# Altium footprint library ref-packages.PCBLIB: 1544 footprints (part 73 of 103)
Each footprint in its own frame and in the unit in brackets; x right, y up, seen from the top. Pads: shape width x height; smd on the part's side, far side on the other; paste and mask are expansions set on the pad; w line width, h text height; cw(c..) or ccw(c..) is an arc to the next point about the centre after c.
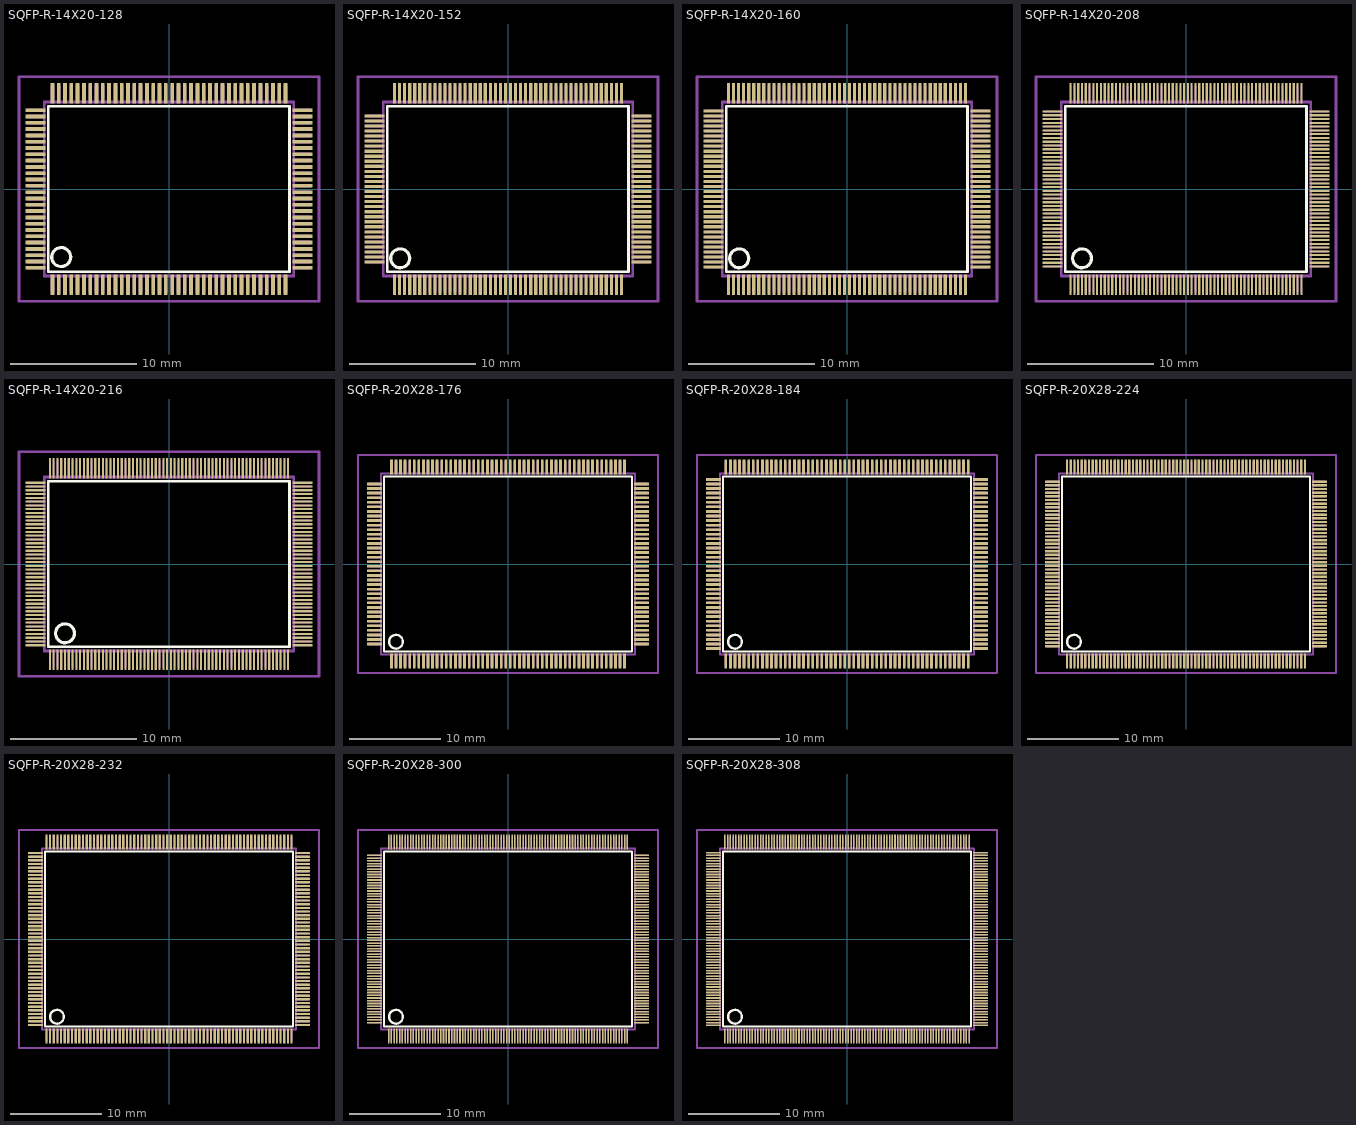
[diagram p72: the footprints below, top view; thin cyan lines are the x and y axes]

## SQFP-R-14X20-128 [mil]
pads (128):
  rect 11.81x62.99 smd: 1(-364.17,-299.21) 2(-344.49,-299.21) 3(-324.8,-299.21) 4(-305.12,-299.21) 5(-285.43,-299.21) 6(-265.75,-299.21) 7(-246.06,-299.21) 8(-226.38,-299.21) 9(-206.69,-299.21) 10(-187.01,-299.21) 11(-167.32,-299.21) 12(-147.64,-299.21) 13(-127.95,-299.21) 14(-108.27,-299.21) 15(-88.58,-299.21) 16(-68.9,-299.21) 17(-49.21,-299.21) 18(-29.53,-299.21) 19(-9.84,-299.21) 20(9.84,-299.21) 21(29.53,-299.21) 22(49.21,-299.21) 23(68.9,-299.21) 24(88.58,-299.21) 25(108.27,-299.21) 26(127.95,-299.21) 27(147.64,-299.21) 28(167.32,-299.21) 29(187.01,-299.21) 30(206.69,-299.21) 31(226.38,-299.21) 32(246.06,-299.21) 33(265.75,-299.21) 34(285.43,-299.21) 35(305.12,-299.21) 36(324.8,-299.21) 37(344.49,-299.21) 38(364.17,-299.21) 65(364.17,299.21) 66(344.49,299.21) 67(324.8,299.21) 68(305.12,299.21) 69(285.43,299.21) 70(265.75,299.21) 71(246.06,299.21) 72(226.38,299.21) 73(206.69,299.21) 74(187.01,299.21) 75(167.32,299.21) 76(147.64,299.21) 77(127.95,299.21) 78(108.27,299.21) 79(88.58,299.21) 80(68.9,299.21) 81(49.21,299.21) 82(29.53,299.21) 83(9.84,299.21) 84(-9.84,299.21) 85(-29.53,299.21) 86(-49.21,299.21) 87(-68.9,299.21) 88(-88.58,299.21) 89(-108.27,299.21) 90(-127.95,299.21) 91(-147.64,299.21) 92(-167.32,299.21) 93(-187.01,299.21) 94(-206.69,299.21) 95(-226.38,299.21) 96(-246.06,299.21) 97(-265.75,299.21) 98(-285.43,299.21) 99(-305.12,299.21) 100(-324.8,299.21) 101(-344.49,299.21) 102(-364.17,299.21)
  rect 62.99x11.81 smd: 39(417.32,-246.06) 40(417.32,-226.38) 41(417.32,-206.69) 42(417.32,-187.01) 43(417.32,-167.32) 44(417.32,-147.64) 45(417.32,-127.95) 46(417.32,-108.27) 47(417.32,-88.58) 48(417.32,-68.9) 49(417.32,-49.21) 50(417.32,-29.53) 51(417.32,-9.84) 52(417.32,9.84) 53(417.32,29.53) 54(417.32,49.21) 55(417.32,68.9) 56(417.32,88.58) 57(417.32,108.27) 58(417.32,127.95) 59(417.32,147.64) 60(417.32,167.32) 61(417.32,187.01) 62(417.32,206.69) 63(417.32,226.38) 64(417.32,246.06) 103(-417.32,246.06) 104(-417.32,226.38) 105(-417.32,206.69) 106(-417.32,187.01) 107(-417.32,167.32) 108(-417.32,147.64) 109(-417.32,127.95) 110(-417.32,108.27) 111(-417.32,88.58) 112(-417.32,68.9) 113(-417.32,49.21) 114(-417.32,29.53) 115(-417.32,9.84) 116(-417.32,-9.84) 117(-417.32,-29.53) 118(-417.32,-49.21) 119(-417.32,-68.9) 120(-417.32,-88.58) 121(-417.32,-108.27) 122(-417.32,-127.95) 123(-417.32,-147.64) 124(-417.32,-167.32) 125(-417.32,-187.01) 126(-417.32,-206.69) 127(-417.32,-226.38) 128(-417.32,-246.06)
Top Overlay:
  circle w10: c-336.61,-212.6 r29.52
  lines w8: -376.77,-258.27 376.38,-258.27 376.38,258.27 -376.77,258.27 -376.77,-258.27
Mechanical 16:
  rectangle: -370.08,-323.62 -358.27,-273.62
  rectangle: -350.39,-323.62 -338.58,-273.62
  rectangle: -330.71,-323.62 -318.9,-273.62
  rectangle: -311.02,-323.62 -299.21,-273.62
  rectangle: -291.34,-323.62 -279.53,-273.62
  rectangle: -271.65,-323.62 -259.84,-273.62
  rectangle: -251.97,-323.62 -240.16,-273.62
  rectangle: -232.28,-323.62 -220.47,-273.62
  rectangle: -212.6,-323.62 -200.79,-273.62
  rectangle: -192.91,-323.62 -181.1,-273.62
  rectangle: -173.23,-323.62 -161.42,-273.62
  rectangle: -153.54,-323.62 -141.73,-273.62
  rectangle: -133.86,-323.62 -122.05,-273.62
  rectangle: -114.17,-323.62 -102.36,-273.62
  rectangle: -94.49,-323.62 -82.68,-273.62
  rectangle: -74.8,-323.62 -62.99,-273.62
  rectangle: -55.12,-323.62 -43.31,-273.62
  rectangle: -35.43,-323.62 -23.62,-273.62
  rectangle: -15.75,-323.62 -3.94,-273.62
  rectangle: 3.94,-323.62 15.75,-273.62
  rectangle: 23.62,-323.62 35.43,-273.62
  rectangle: 43.31,-323.62 55.12,-273.62
  rectangle: 62.99,-323.62 74.8,-273.62
  rectangle: 82.68,-323.62 94.49,-273.62
  rectangle: 102.36,-323.62 114.17,-273.62
  rectangle: 122.05,-323.62 133.86,-273.62
  rectangle: 141.73,-323.62 153.54,-273.62
  rectangle: 161.42,-323.62 173.23,-273.62
  rectangle: 181.1,-323.62 192.91,-273.62
  rectangle: 200.79,-323.62 212.6,-273.62
  rectangle: 220.47,-323.62 232.28,-273.62
  rectangle: 240.16,-323.62 251.97,-273.62
  rectangle: 259.84,-323.62 271.65,-273.62
  rectangle: 279.53,-323.62 291.34,-273.62
  rectangle: 299.21,-323.62 311.02,-273.62
  rectangle: 318.9,-323.62 330.71,-273.62
  rectangle: 391.73,-251.97 441.73,-240.16
  rectangle: 338.58,-323.62 350.39,-273.62
  rectangle: 358.27,-323.62 370.08,-273.62
  rectangle: 391.73,-232.28 441.73,-220.47
  rectangle: 391.73,-212.6 441.73,-200.79
  rectangle: 391.73,-192.91 441.73,-181.1
  rectangle: 391.73,-173.23 441.73,-161.42
  rectangle: 391.73,-153.54 441.73,-141.73
  rectangle: 391.73,-133.86 441.73,-122.05
  rectangle: 391.73,-114.17 441.73,-102.36
  rectangle: 391.73,-94.49 441.73,-82.68
  rectangle: 391.73,-74.8 441.73,-62.99
  rectangle: 391.73,-55.12 441.73,-43.31
  rectangle: 391.73,-35.43 441.73,-23.62
  rectangle: 391.73,-15.75 441.73,-3.94
  rectangle: 391.73,3.94 441.73,15.75
  rectangle: 391.73,23.62 441.73,35.43
  rectangle: 391.73,43.31 441.73,55.12
  rectangle: 391.73,62.99 441.73,74.8
  rectangle: 391.73,82.68 441.73,94.49
  rectangle: 391.73,102.36 441.73,114.17
  rectangle: 391.73,122.05 441.73,133.86
  rectangle: 391.73,141.73 441.73,153.54
  rectangle: 391.73,161.42 441.73,173.23
  rectangle: 391.73,181.1 441.73,192.91
  rectangle: 391.73,200.79 441.73,212.6
  rectangle: 391.73,220.47 441.73,232.28
  rectangle: 391.73,240.16 441.73,251.97
  rectangle: 358.27,273.62 370.08,323.62
  rectangle: 338.58,273.62 350.39,323.62
  rectangle: 318.9,273.62 330.71,323.62
  rectangle: 299.21,273.62 311.02,323.62
  rectangle: 279.53,273.62 291.34,323.62
  rectangle: 259.84,273.62 271.65,323.62
  rectangle: 240.16,273.62 251.97,323.62
  rectangle: 220.47,273.62 232.28,323.62
  rectangle: 200.79,273.62 212.6,323.62
  rectangle: 181.1,273.62 192.91,323.62
  rectangle: 161.42,273.62 173.23,323.62
  rectangle: 141.73,273.62 153.54,323.62
  rectangle: 122.05,273.62 133.86,323.62
  rectangle: 102.36,273.62 114.17,323.62
  rectangle: 82.68,273.62 94.49,323.62
  rectangle: 62.99,273.62 74.8,323.62
  rectangle: 43.31,273.62 55.12,323.62
  rectangle: 23.62,273.62 35.43,323.62
  rectangle: 3.94,273.62 15.75,323.62
  rectangle: -15.75,273.62 -3.94,323.62
  rectangle: -35.43,273.62 -23.62,323.62
  rectangle: -55.12,273.62 -43.31,323.62
  rectangle: -74.8,273.62 -62.99,323.62
  rectangle: -94.49,273.62 -82.68,323.62
  rectangle: -114.17,273.62 -102.36,323.62
  rectangle: -133.86,273.62 -122.05,323.62
  rectangle: -153.54,273.62 -141.73,323.62
  rectangle: -173.23,273.62 -161.42,323.62
  rectangle: -192.91,273.62 -181.1,323.62
  rectangle: -212.6,273.62 -200.79,323.62
  rectangle: -232.28,273.62 -220.47,323.62
  rectangle: -251.97,273.62 -240.16,323.62
  rectangle: -271.65,273.62 -259.84,323.62
  rectangle: -291.34,273.62 -279.53,323.62
  rectangle: -311.02,273.62 -299.21,323.62
  rectangle: -330.71,273.62 -318.9,323.62
  rectangle: -350.39,273.62 -338.58,323.62
  rectangle: -370.08,273.62 -358.27,323.62
  rectangle: -441.73,240.16 -391.73,251.97
  rectangle: -441.73,220.47 -391.73,232.28
  rectangle: -441.73,200.79 -391.73,212.6
  rectangle: -441.73,181.1 -391.73,192.91
  rectangle: -441.73,161.42 -391.73,173.23
  rectangle: -441.73,141.73 -391.73,153.54
  rectangle: -441.73,122.05 -391.73,133.86
  rectangle: -441.73,102.36 -391.73,114.17
  rectangle: -441.73,82.68 -391.73,94.49
  rectangle: -441.73,62.99 -391.73,74.8
  rectangle: -441.73,43.31 -391.73,55.12
  rectangle: -441.73,23.62 -391.73,35.43
  rectangle: -441.73,3.94 -391.73,15.75
  rectangle: -441.73,-15.75 -391.73,-3.94
  rectangle: -441.73,-35.43 -391.73,-23.62
  rectangle: -441.73,-55.12 -391.73,-43.31
  rectangle: -441.73,-74.8 -391.73,-62.99
  rectangle: -441.73,-94.49 -391.73,-82.68
  rectangle: -441.73,-114.17 -391.73,-102.36
  rectangle: -441.73,-133.86 -391.73,-122.05
  rectangle: -441.73,-153.54 -391.73,-141.73
  rectangle: -441.73,-173.23 -391.73,-161.42
  rectangle: -441.73,-192.91 -391.73,-181.1
  rectangle: -441.73,-212.6 -391.73,-200.79
  rectangle: -441.73,-232.28 -391.73,-220.47
  rectangle: -441.73,-251.97 -391.73,-240.16
  lines w8: -389.76,-271.65 389.76,-271.65 389.76,271.65 -389.76,271.65 -389.76,-271.65
Mechanical 27:
  lines w7.87: -468.5,-350.39 -468.5,350.39 468.5,350.39 468.5,-350.39 -468.5,-350.39

## SQFP-R-14X20-152 [mm]
pads (152):
  rect 0.25x1.6 smd: 1(-9,-7.6) 2(-8.6,-7.6) 3(-8.2,-7.6) 4(-7.8,-7.6) 5(-7.4,-7.6) 6(-7,-7.6) 7(-6.6,-7.6) 8(-6.2,-7.6) 9(-5.8,-7.6) 10(-5.4,-7.6) 11(-5,-7.6) 12(-4.6,-7.6) 13(-4.2,-7.6) 14(-3.8,-7.6) 15(-3.4,-7.6) 16(-3,-7.6) 17(-2.6,-7.6) 18(-2.2,-7.6) 19(-1.8,-7.6) 20(-1.4,-7.6) 21(-1,-7.6) 22(-0.6,-7.6) 23(-0.2,-7.6) 24(0.2,-7.6) 25(0.6,-7.6) 26(1,-7.6) 27(1.4,-7.6) 28(1.8,-7.6) 29(2.2,-7.6) 30(2.6,-7.6) 31(3,-7.6) 32(3.4,-7.6) 33(3.8,-7.6) 34(4.2,-7.6) 35(4.6,-7.6) 36(5,-7.6) 37(5.4,-7.6) 38(5.8,-7.6) 39(6.2,-7.6) 40(6.6,-7.6) 41(7,-7.6) 42(7.4,-7.6) 43(7.8,-7.6) 44(8.2,-7.6) 45(8.6,-7.6) 46(9,-7.6) 77(9,7.6) 78(8.6,7.6) 79(8.2,7.6) 80(7.8,7.6) 81(7.4,7.6) 82(7,7.6) 83(6.6,7.6) 84(6.2,7.6) 85(5.8,7.6) 86(5.4,7.6) 87(5,7.6) 88(4.6,7.6) 89(4.2,7.6) 90(3.8,7.6) 91(3.4,7.6) 92(3,7.6) 93(2.6,7.6) 94(2.2,7.6) 95(1.8,7.6) 96(1.4,7.6) 97(1,7.6) 98(0.6,7.6) 99(0.2,7.6) 100(-0.2,7.6) 101(-0.6,7.6) 102(-1,7.6) 103(-1.4,7.6) 104(-1.8,7.6) 105(-2.2,7.6) 106(-2.6,7.6) 107(-3,7.6) 108(-3.4,7.6) 109(-3.8,7.6) 110(-4.2,7.6) 111(-4.6,7.6) 112(-5,7.6) 113(-5.4,7.6) 114(-5.8,7.6) 115(-6.2,7.6) 116(-6.6,7.6) 117(-7,7.6) 118(-7.4,7.6) 119(-7.8,7.6) 120(-8.2,7.6) 121(-8.6,7.6) 122(-9,7.6)
  rect 1.6x0.25 smd: 47(10.6,-5.8) 48(10.6,-5.4) 49(10.6,-5) 50(10.6,-4.6) 51(10.6,-4.2) 52(10.6,-3.8) 53(10.6,-3.4) 54(10.6,-3) 55(10.6,-2.6) 56(10.6,-2.2) 57(10.6,-1.8) 58(10.6,-1.4) 59(10.6,-1) 60(10.6,-0.6) 61(10.6,-0.2) 62(10.6,0.2) 63(10.6,0.6) 64(10.6,1) 65(10.6,1.4) 66(10.6,1.8) 67(10.6,2.2) 68(10.6,2.6) 69(10.6,3) 70(10.6,3.4) 71(10.6,3.8) 72(10.6,4.2) 73(10.6,4.6) 74(10.6,5) 75(10.6,5.4) 76(10.6,5.8) 123(-10.6,5.8) 124(-10.6,5.4) 125(-10.6,5) 126(-10.6,4.6) 127(-10.6,4.2) 128(-10.6,3.8) 129(-10.6,3.4) 130(-10.6,3) 131(-10.6,2.6) 132(-10.6,2.2) 133(-10.6,1.8) 134(-10.6,1.4) 135(-10.6,1) 136(-10.6,0.6) 137(-10.6,0.2) 138(-10.6,-0.2) 139(-10.6,-0.6) 140(-10.6,-1) 141(-10.6,-1.4) 142(-10.6,-1.8) 143(-10.6,-2.2) 144(-10.6,-2.6) 145(-10.6,-3) 146(-10.6,-3.4) 147(-10.6,-3.8) 148(-10.6,-4.2) 149(-10.6,-4.6) 150(-10.6,-5) 151(-10.6,-5.4) 152(-10.6,-5.8)
Top Overlay:
  circle w0.254: c-8.55,-5.5 r0.75
  lines w0.203: -9.57,-6.56 9.56,-6.56 9.56,6.56 -9.57,6.56 -9.57,-6.56
Mechanical 16:
  drawing of 156 lines, arcs and shapes, not listed
Mechanical 27:
  lines w0.2: -11.9,-8.9 -11.9,8.9 11.9,8.9 11.9,-8.9 -11.9,-8.9

## SQFP-R-14X20-160 [mm]
pads (160):
  rect 0.25x1.6 smd: 1(-9.4,-7.6) 2(-9,-7.6) 3(-8.6,-7.6) 4(-8.2,-7.6) 5(-7.8,-7.6) 6(-7.4,-7.6) 7(-7,-7.6) 8(-6.6,-7.6) 9(-6.2,-7.6) 10(-5.8,-7.6) 11(-5.4,-7.6) 12(-5,-7.6) 13(-4.6,-7.6) 14(-4.2,-7.6) 15(-3.8,-7.6) 16(-3.4,-7.6) 17(-3,-7.6) 18(-2.6,-7.6) 19(-2.2,-7.6) 20(-1.8,-7.6) 21(-1.4,-7.6) 22(-1,-7.6) 23(-0.6,-7.6) 24(-0.2,-7.6) 25(0.2,-7.6) 26(0.6,-7.6) 27(1,-7.6) 28(1.4,-7.6) 29(1.8,-7.6) 30(2.2,-7.6) 31(2.6,-7.6) 32(3,-7.6) 33(3.4,-7.6) 34(3.8,-7.6) 35(4.2,-7.6) 36(4.6,-7.6) 37(5,-7.6) 38(5.4,-7.6) 39(5.8,-7.6) 40(6.2,-7.6) 41(6.6,-7.6) 42(7,-7.6) 43(7.4,-7.6) 44(7.8,-7.6) 45(8.2,-7.6) 46(8.6,-7.6) 47(9,-7.6) 48(9.4,-7.6) 81(9.4,7.6) 82(9,7.6) 83(8.6,7.6) 84(8.2,7.6) 85(7.8,7.6) 86(7.4,7.6) 87(7,7.6) 88(6.6,7.6) 89(6.2,7.6) 90(5.8,7.6) 91(5.4,7.6) 92(5,7.6) 93(4.6,7.6) 94(4.2,7.6) 95(3.8,7.6) 96(3.4,7.6) 97(3,7.6) 98(2.6,7.6) 99(2.2,7.6) 100(1.8,7.6) 101(1.4,7.6) 102(1,7.6) 103(0.6,7.6) 104(0.2,7.6) 105(-0.2,7.6) 106(-0.6,7.6) 107(-1,7.6) 108(-1.4,7.6) 109(-1.8,7.6) 110(-2.2,7.6) 111(-2.6,7.6) 112(-3,7.6) 113(-3.4,7.6) 114(-3.8,7.6) 115(-4.2,7.6) 116(-4.6,7.6) 117(-5,7.6) 118(-5.4,7.6) 119(-5.8,7.6) 120(-6.2,7.6) 121(-6.6,7.6) 122(-7,7.6) 123(-7.4,7.6) 124(-7.8,7.6) 125(-8.2,7.6) 126(-8.6,7.6) 127(-9,7.6) 128(-9.4,7.6)
  rect 1.6x0.25 smd: 49(10.6,-6.2) 50(10.6,-5.8) 51(10.6,-5.4) 52(10.6,-5) 53(10.6,-4.6) 54(10.6,-4.2) 55(10.6,-3.8) 56(10.6,-3.4) 57(10.6,-3) 58(10.6,-2.6) 59(10.6,-2.2) 60(10.6,-1.8) 61(10.6,-1.4) 62(10.6,-1) 63(10.6,-0.6) 64(10.6,-0.2) 65(10.6,0.2) 66(10.6,0.6) 67(10.6,1) 68(10.6,1.4) 69(10.6,1.8) 70(10.6,2.2) 71(10.6,2.6) 72(10.6,3) 73(10.6,3.4) 74(10.6,3.8) 75(10.6,4.2) 76(10.6,4.6) 77(10.6,5) 78(10.6,5.4) 79(10.6,5.8) 80(10.6,6.2) 129(-10.6,6.2) 130(-10.6,5.8) 131(-10.6,5.4) 132(-10.6,5) 133(-10.6,4.6) 134(-10.6,4.2) 135(-10.6,3.8) 136(-10.6,3.4) 137(-10.6,3) 138(-10.6,2.6) 139(-10.6,2.2) 140(-10.6,1.8) 141(-10.6,1.4) 142(-10.6,1) 143(-10.6,0.6) 144(-10.6,0.2) 145(-10.6,-0.2) 146(-10.6,-0.6) 147(-10.6,-1) 148(-10.6,-1.4) 149(-10.6,-1.8) 150(-10.6,-2.2) 151(-10.6,-2.6) 152(-10.6,-3) 153(-10.6,-3.4) 154(-10.6,-3.8) 155(-10.6,-4.2) 156(-10.6,-4.6) 157(-10.6,-5) 158(-10.6,-5.4) 159(-10.6,-5.8) 160(-10.6,-6.2)
Top Overlay:
  circle w0.254: c-8.55,-5.5 r0.75
  lines w0.203: -9.57,-6.56 9.56,-6.56 9.56,6.56 -9.57,6.56 -9.57,-6.56
Mechanical 16:
  drawing of 164 lines, arcs and shapes, not listed
Mechanical 27:
  lines w0.2: -11.9,-8.9 -11.9,8.9 11.9,8.9 11.9,-8.9 -11.9,-8.9

## SQFP-R-14X20-208 [mm]
pads (208):
  rect 0.17x1.6 smd: 1(-9.15,-7.6) 2(-8.85,-7.6) 3(-8.55,-7.6) 4(-8.25,-7.6) 5(-7.95,-7.6) 6(-7.65,-7.6) 7(-7.35,-7.6) 8(-7.05,-7.6) 9(-6.75,-7.6) 10(-6.45,-7.6) 11(-6.15,-7.6) 12(-5.85,-7.6) 13(-5.55,-7.6) 14(-5.25,-7.6) 15(-4.95,-7.6) 16(-4.65,-7.6) 17(-4.35,-7.6) 18(-4.05,-7.6) 19(-3.75,-7.6) 20(-3.45,-7.6) 21(-3.15,-7.6) 22(-2.85,-7.6) 23(-2.55,-7.6) 24(-2.25,-7.6) 25(-1.95,-7.6) 26(-1.65,-7.6) 27(-1.35,-7.6) 28(-1.05,-7.6) 29(-0.75,-7.6) 30(-0.45,-7.6) 31(-0.15,-7.6) 32(0.15,-7.6) 33(0.45,-7.6) 34(0.75,-7.6) 35(1.05,-7.6) 36(1.35,-7.6) 37(1.65,-7.6) 38(1.95,-7.6) 39(2.25,-7.6) 40(2.55,-7.6) 41(2.85,-7.6) 42(3.15,-7.6) 43(3.45,-7.6) 44(3.75,-7.6) 45(4.05,-7.6) 46(4.35,-7.6) 47(4.65,-7.6) 48(4.95,-7.6) 49(5.25,-7.6) 50(5.55,-7.6) 51(5.85,-7.6) 52(6.15,-7.6) 53(6.45,-7.6) 54(6.75,-7.6) 55(7.05,-7.6) 56(7.35,-7.6) 57(7.65,-7.6) 58(7.95,-7.6) 59(8.25,-7.6) 60(8.55,-7.6) 61(8.85,-7.6) 62(9.15,-7.6) 105(9.15,7.6) 106(8.85,7.6) 107(8.55,7.6) 108(8.25,7.6) 109(7.95,7.6) 110(7.65,7.6) 111(7.35,7.6) 112(7.05,7.6) 113(6.75,7.6) 114(6.45,7.6) 115(6.15,7.6) 116(5.85,7.6) 117(5.55,7.6) 118(5.25,7.6) 119(4.95,7.6) 120(4.65,7.6) 121(4.35,7.6) 122(4.05,7.6) 123(3.75,7.6) 124(3.45,7.6) 125(3.15,7.6) 126(2.85,7.6) 127(2.55,7.6) 128(2.25,7.6) 129(1.95,7.6) 130(1.65,7.6) 131(1.35,7.6) 132(1.05,7.6) 133(0.75,7.6) 134(0.45,7.6) 135(0.15,7.6) 136(-0.15,7.6) 137(-0.45,7.6) 138(-0.75,7.6) 139(-1.05,7.6) 140(-1.35,7.6) 141(-1.65,7.6) 142(-1.95,7.6) 143(-2.25,7.6) 144(-2.55,7.6) 145(-2.85,7.6) 146(-3.15,7.6) 147(-3.45,7.6) 148(-3.75,7.6) 149(-4.05,7.6) 150(-4.35,7.6) 151(-4.65,7.6) 152(-4.95,7.6) 153(-5.25,7.6) 154(-5.55,7.6) 155(-5.85,7.6) 156(-6.15,7.6) 157(-6.45,7.6) 158(-6.75,7.6) 159(-7.05,7.6) 160(-7.35,7.6) 161(-7.65,7.6) 162(-7.95,7.6) 163(-8.25,7.6) 164(-8.55,7.6) 165(-8.85,7.6) 166(-9.15,7.6)
  rect 1.6x0.17 smd: 63(10.6,-6.15) 64(10.6,-5.85) 65(10.6,-5.55) 66(10.6,-5.25) 67(10.6,-4.95) 68(10.6,-4.65) 69(10.6,-4.35) 70(10.6,-4.05) 71(10.6,-3.75) 72(10.6,-3.45) 73(10.6,-3.15) 74(10.6,-2.85) 75(10.6,-2.55) 76(10.6,-2.25) 77(10.6,-1.95) 78(10.6,-1.65) 79(10.6,-1.35) 80(10.6,-1.05) 81(10.6,-0.75) 82(10.6,-0.45) 83(10.6,-0.15) 84(10.6,0.15) 85(10.6,0.45) 86(10.6,0.75) 87(10.6,1.05) 88(10.6,1.35) 89(10.6,1.65) 90(10.6,1.95) 91(10.6,2.25) 92(10.6,2.55) 93(10.6,2.85) 94(10.6,3.15) 95(10.6,3.45) 96(10.6,3.75) 97(10.6,4.05) 98(10.6,4.35) 99(10.6,4.65) 100(10.6,4.95) 101(10.6,5.25) 102(10.6,5.55) 103(10.6,5.85) 104(10.6,6.15) 167(-10.6,6.15) 168(-10.6,5.85) 169(-10.6,5.55) 170(-10.6,5.25) 171(-10.6,4.95) 172(-10.6,4.65) 173(-10.6,4.35) 174(-10.6,4.05) 175(-10.6,3.75) 176(-10.6,3.45) 177(-10.6,3.15) 178(-10.6,2.85) 179(-10.6,2.55) 180(-10.6,2.25) 181(-10.6,1.95) 182(-10.6,1.65) 183(-10.6,1.35) 184(-10.6,1.05) 185(-10.6,0.75) 186(-10.6,0.45) 187(-10.6,0.15) 188(-10.6,-0.15) 189(-10.6,-0.45) 190(-10.6,-0.75) 191(-10.6,-1.05) 192(-10.6,-1.35) 193(-10.6,-1.65) 194(-10.6,-1.95) 195(-10.6,-2.25) 196(-10.6,-2.55) 197(-10.6,-2.85) 198(-10.6,-3.15) 199(-10.6,-3.45) 200(-10.6,-3.75) 201(-10.6,-4.05) 202(-10.6,-4.35) 203(-10.6,-4.65) 204(-10.6,-4.95) 205(-10.6,-5.25) 206(-10.6,-5.55) 207(-10.6,-5.85) 208(-10.6,-6.15)
Top Overlay:
  circle w0.254: c-8.25,-5.5 r0.75
  lines w0.203: -9.57,-6.56 9.56,-6.56 9.56,6.56 -9.57,6.56 -9.57,-6.56
Mechanical 16:
  drawing of 212 lines, arcs and shapes, not listed
Mechanical 27:
  lines w0.2: -11.9,-8.9 -11.9,8.9 11.9,8.9 11.9,-8.9 -11.9,-8.9

## SQFP-R-14X20-216 [mm]
pads (216):
  rect 0.17x1.6 smd: 1(-9.45,-7.6) 2(-9.15,-7.6) 3(-8.85,-7.6) 4(-8.55,-7.6) 5(-8.25,-7.6) 6(-7.95,-7.6) 7(-7.65,-7.6) 8(-7.35,-7.6) 9(-7.05,-7.6) 10(-6.75,-7.6) 11(-6.45,-7.6) 12(-6.15,-7.6) 13(-5.85,-7.6) 14(-5.55,-7.6) 15(-5.25,-7.6) 16(-4.95,-7.6) 17(-4.65,-7.6) 18(-4.35,-7.6) 19(-4.05,-7.6) 20(-3.75,-7.6) 21(-3.45,-7.6) 22(-3.15,-7.6) 23(-2.85,-7.6) 24(-2.55,-7.6) 25(-2.25,-7.6) 26(-1.95,-7.6) 27(-1.65,-7.6) 28(-1.35,-7.6) 29(-1.05,-7.6) 30(-0.75,-7.6) 31(-0.45,-7.6) 32(-0.15,-7.6) 33(0.15,-7.6) 34(0.45,-7.6) 35(0.75,-7.6) 36(1.05,-7.6) 37(1.35,-7.6) 38(1.65,-7.6) 39(1.95,-7.6) 40(2.25,-7.6) 41(2.55,-7.6) 42(2.85,-7.6) 43(3.15,-7.6) 44(3.45,-7.6) 45(3.75,-7.6) 46(4.05,-7.6) 47(4.35,-7.6) 48(4.65,-7.6) 49(4.95,-7.6) 50(5.25,-7.6) 51(5.55,-7.6) 52(5.85,-7.6) 53(6.15,-7.6) 54(6.45,-7.6) 55(6.75,-7.6) 56(7.05,-7.6) 57(7.35,-7.6) 58(7.65,-7.6) 59(7.95,-7.6) 60(8.25,-7.6) 61(8.55,-7.6) 62(8.85,-7.6) 63(9.15,-7.6) 64(9.45,-7.6) 109(9.45,7.6) 110(9.15,7.6) 111(8.85,7.6) 112(8.55,7.6) 113(8.25,7.6) 114(7.95,7.6) 115(7.65,7.6) 116(7.35,7.6) 117(7.05,7.6) 118(6.75,7.6) 119(6.45,7.6) 120(6.15,7.6) 121(5.85,7.6) 122(5.55,7.6) 123(5.25,7.6) 124(4.95,7.6) 125(4.65,7.6) 126(4.35,7.6) 127(4.05,7.6) 128(3.75,7.6) 129(3.45,7.6) 130(3.15,7.6) 131(2.85,7.6) 132(2.55,7.6) 133(2.25,7.6) 134(1.95,7.6) 135(1.65,7.6) 136(1.35,7.6) 137(1.05,7.6) 138(0.75,7.6) 139(0.45,7.6) 140(0.15,7.6) 141(-0.15,7.6) 142(-0.45,7.6) 143(-0.75,7.6) 144(-1.05,7.6) 145(-1.35,7.6) 146(-1.65,7.6) 147(-1.95,7.6) 148(-2.25,7.6) 149(-2.55,7.6) 150(-2.85,7.6) 151(-3.15,7.6) 152(-3.45,7.6) 153(-3.75,7.6) 154(-4.05,7.6) 155(-4.35,7.6) 156(-4.65,7.6) 157(-4.95,7.6) 158(-5.25,7.6) 159(-5.55,7.6) 160(-5.85,7.6) 161(-6.15,7.6) 162(-6.45,7.6) 163(-6.75,7.6) 164(-7.05,7.6) 165(-7.35,7.6) 166(-7.65,7.6) 167(-7.95,7.6) 168(-8.25,7.6) 169(-8.55,7.6) 170(-8.85,7.6) 171(-9.15,7.6) 172(-9.45,7.6)
  rect 1.6x0.17 smd: 65(10.6,-6.45) 66(10.6,-6.15) 67(10.6,-5.85) 68(10.6,-5.55) 69(10.6,-5.25) 70(10.6,-4.95) 71(10.6,-4.65) 72(10.6,-4.35) 73(10.6,-4.05) 74(10.6,-3.75) 75(10.6,-3.45) 76(10.6,-3.15) 77(10.6,-2.85) 78(10.6,-2.55) 79(10.6,-2.25) 80(10.6,-1.95) 81(10.6,-1.65) 82(10.6,-1.35) 83(10.6,-1.05) 84(10.6,-0.75) 85(10.6,-0.45) 86(10.6,-0.15) 87(10.6,0.15) 88(10.6,0.45) 89(10.6,0.75) 90(10.6,1.05) 91(10.6,1.35) 92(10.6,1.65) 93(10.6,1.95) 94(10.6,2.25) 95(10.6,2.55) 96(10.6,2.85) 97(10.6,3.15) 98(10.6,3.45) 99(10.6,3.75) 100(10.6,4.05) 101(10.6,4.35) 102(10.6,4.65) 103(10.6,4.95) 104(10.6,5.25) 105(10.6,5.55) 106(10.6,5.85) 107(10.6,6.15) 108(10.6,6.45) 173(-10.6,6.45) 174(-10.6,6.15) 175(-10.6,5.85) 176(-10.6,5.55) 177(-10.6,5.25) 178(-10.6,4.95) 179(-10.6,4.65) 180(-10.6,4.35) 181(-10.6,4.05) 182(-10.6,3.75) 183(-10.6,3.45) 184(-10.6,3.15) 185(-10.6,2.85) 186(-10.6,2.55) 187(-10.6,2.25) 188(-10.6,1.95) 189(-10.6,1.65) 190(-10.6,1.35) 191(-10.6,1.05) 192(-10.6,0.75) 193(-10.6,0.45) 194(-10.6,0.15) 195(-10.6,-0.15) 196(-10.6,-0.45) 197(-10.6,-0.75) 198(-10.6,-1.05) 199(-10.6,-1.35) 200(-10.6,-1.65) 201(-10.6,-1.95) 202(-10.6,-2.25) 203(-10.6,-2.55) 204(-10.6,-2.85) 205(-10.6,-3.15) 206(-10.6,-3.45) 207(-10.6,-3.75) 208(-10.6,-4.05) 209(-10.6,-4.35) 210(-10.6,-4.65) 211(-10.6,-4.95) 212(-10.6,-5.25) 213(-10.6,-5.55) 214(-10.6,-5.85) 215(-10.6,-6.15) 216(-10.6,-6.45)
Top Overlay:
  circle w0.254: c-8.25,-5.5 r0.75
  lines w0.203: -9.57,-6.56 9.56,-6.56 9.56,6.56 -9.57,6.56 -9.57,-6.56
Mechanical 16:
  drawing of 220 lines, arcs and shapes, not listed
Mechanical 27:
  lines w0.2: -11.9,-8.9 -11.9,8.9 11.9,8.9 11.9,-8.9 -11.9,-8.9
